# Altium schematic symbol library IC_Maxim.SchLib: 843 symbols (part 17 of 20) (continued)
## MAX8510EXK15+ (continued)

## MAX8510EXK18+
designator U?
Ultra-Low-Noise, High PSRR, Low-Dropout, 120mA Linear Regulator, 1.8V Out, 5-Pin SC70, -40癈 to +85癈, Pb-Free; DatasheetVersion: Rev 4, Aug-2011; PackageVersion: revE, 2006; PackageReference: X5+1; PackageDescription: 5-Pin SC70 Transistor Package, 0.65 mm Pitch, 2.2 mm Lead Span; Code_JEDEC: MO-203; ComponentLink1Description: Manufacturer URL; ComponentLink1URL: http://www.maxim-ic.com; ComponentLink2Description: Datasheet; ComponentLink2URL: http://datasheets.maxim-ic.com/en/ds/MAX8510-MAX8512.pdf; ComponentLink3Description: Package Specification; ComponentLink3URL: http://pdfserv.maxim-ic.com/package_dwgs/21-0076.PDF
footprint SOT353 (Footprint not found)
pins: 1 IN (power), 2 GND (power), 3 ~{SHDN} (in), 4 BP, 5 OUT (power)

## MAX8510EXK18+G65
designator U?
Ultra-Low-Noise, High PSRR, Low-Dropout, 120mA Linear Regulator, 1.8V Out, 5-Pin SC70, -40癈 to +85癈, Pb-Free; DatasheetVersion: Rev 4, Aug-2011; PackageVersion: revE, 2006; PackageReference: X5+1; PackageDescription: 5-Pin SC70 Transistor Package, 0.65 mm Pitch, 2.2 mm Lead Span; Code_JEDEC: MO-203; ComponentLink1Description: Manufacturer URL; ComponentLink1URL: http://www.maxim-ic.com; ComponentLink2Description: Datasheet; ComponentLink2URL: http://datasheets.maxim-ic.com/en/ds/MAX8510-MAX8512.pdf; ComponentLink3Description: Package Specification; ComponentLink3URL: http://pdfserv.maxim-ic.com/package_dwgs/21-0076.PDF
footprint SOT353 (Footprint not found)
pins: 1 IN (power), 2 GND (power), 3 ~{SHDN} (in), 4 BP, 5 OUT (power)

## MAX8510EXK21+
designator U?
Ultra-Low-Noise, High PSRR, Low-Dropout, 120mA Linear Regulator, 5-Pin SC70, -40癈 to +85癈, Pb-Free; DatasheetVersion: Rev 4, Aug-2011; PackageVersion: revE, 2006; PackageReference: X5+1; PackageDescription: 5-Pin SC70 Transistor Package, 0.65 mm Pitch, 2.2 mm Lead Span; Code_JEDEC: MO-203; ComponentLink1Description: Manufacturer URL; ComponentLink1URL: http://www.maxim-ic.com; ComponentLink2Description: Datasheet; ComponentLink2URL: http://datasheets.maxim-ic.com/en/ds/MAX8510-MAX8512.pdf; ComponentLink3Description: Package Specification; ComponentLink3URL: http://pdfserv.maxim-ic.com/package_dwgs/21-0076.PDF
footprint SOT353 (Footprint not found)
pins: 1 IN (power), 2 GND (power), 3 ~{SHDN} (in), 4 BP, 5 OUT (power)

## MAX8510EXK25
designator U?
Ultra-Low-Noise, High PSRR, Low-Dropout, 120mA Linear Regulator, 2.5V Out, 5-Pin SC70, -40癈 to +85癈; DatasheetVersion: Rev 4, Aug-2011; PackageVersion: revE, 2006; PackageReference: X5-1; PackageDescription: 5-Pin SC70 Transistor Package, 0.65 mm Pitch, 2.2 mm Lead Span; Code_JEDEC: MO-203; ComponentLink1Description: Manufacturer URL; ComponentLink1URL: http://www.maxim-ic.com; ComponentLink2Description: Datasheet; ComponentLink2URL: http://datasheets.maxim-ic.com/en/ds/MAX8510-MAX8512.pdf; ComponentLink3Description: Package Specification; ComponentLink3URL: http://pdfserv.maxim-ic.com/package_dwgs/21-0076.PDF
footprint SOT353 (Footprint not found)
pins: 1 IN (power), 2 GND (power), 3 ~{SHDN} (in), 4 BP, 5 OUT (power)

## MAX8510EXK25+
designator U?
Ultra-Low-Noise, High PSRR, Low-Dropout, 120mA Linear Regulator, 2.5V Out, 5-Pin SC70, -40癈 to +85癈, Pb-Free; DatasheetVersion: Rev 4, Aug-2011; PackageVersion: revE, 2006; PackageReference: X5+1; PackageDescription: 5-Pin SC70 Transistor Package, 0.65 mm Pitch, 2.2 mm Lead Span; Code_JEDEC: MO-203; ComponentLink1Description: Manufacturer URL; ComponentLink1URL: http://www.maxim-ic.com; ComponentLink2Description: Datasheet; ComponentLink2URL: http://datasheets.maxim-ic.com/en/ds/MAX8510-MAX8512.pdf; ComponentLink3Description: Package Specification; ComponentLink3URL: http://pdfserv.maxim-ic.com/package_dwgs/21-0076.PDF
footprint SOT353 (Footprint not found)
pins: 1 IN (power), 2 GND (power), 3 ~{SHDN} (in), 4 BP, 5 OUT (power)

## MAX8510EXK27
designator U?
Ultra-Low-Noise, High PSRR, Low-Dropout, 120mA Linear Regulator, 2.7V Out, 5-Pin SC70, -40癈 to +85癈; DatasheetVersion: Rev 4, Aug-2011; PackageVersion: revE, 2006; PackageReference: X5-1; PackageDescription: 5-Pin SC70 Transistor Package, 0.65 mm Pitch, 2.2 mm Lead Span; Code_JEDEC: MO-203; ComponentLink1Description: Manufacturer URL; ComponentLink1URL: http://www.maxim-ic.com; ComponentLink2Description: Datasheet; ComponentLink2URL: http://datasheets.maxim-ic.com/en/ds/MAX8510-MAX8512.pdf; ComponentLink3Description: Package Specification; ComponentLink3URL: http://pdfserv.maxim-ic.com/package_dwgs/21-0076.PDF
footprint SOT353 (Footprint not found)
pins: 1 IN (power), 2 GND (power), 3 ~{SHDN} (in), 4 BP, 5 OUT (power)

## MAX8510EXK27+
designator U?
Ultra-Low-Noise, High PSRR, Low-Dropout, 120mA Linear Regulator, 2.7V Out, 5-Pin SC70, -40癈 to +85癈, Pb-Free; DatasheetVersion: Rev 4, Aug-2011; PackageVersion: revE, 2006; PackageReference: X5+1; PackageDescription: 5-Pin SC70 Transistor Package, 0.65 mm Pitch, 2.2 mm Lead Span; Code_JEDEC: MO-203; ComponentLink1Description: Manufacturer URL; ComponentLink1URL: http://www.maxim-ic.com; ComponentLink2Description: Datasheet; ComponentLink2URL: http://datasheets.maxim-ic.com/en/ds/MAX8510-MAX8512.pdf; ComponentLink3Description: Package Specification; ComponentLink3URL: http://pdfserv.maxim-ic.com/package_dwgs/21-0076.PDF
footprint SOT353 (Footprint not found)
pins: 1 IN (power), 2 GND (power), 3 ~{SHDN} (in), 4 BP, 5 OUT (power)

## MAX8510EXK28+
designator U?
Ultra-Low-Noise, High PSRR, Low-Dropout, 120mA Linear Regulator, 2.8V Out, 5-Pin SC70, -40癈 to +85癈, Pb-Free; DatasheetVersion: Rev 4, Aug-2011; PackageVersion: revE, 2006; PackageReference: X5+1; PackageDescription: 5-Pin SC70 Transistor Package, 0.65 mm Pitch, 2.2 mm Lead Span; Code_JEDEC: MO-203; ComponentLink1Description: Manufacturer URL; ComponentLink1URL: http://www.maxim-ic.com; ComponentLink2Description: Datasheet; ComponentLink2URL: http://datasheets.maxim-ic.com/en/ds/MAX8510-MAX8512.pdf; ComponentLink3Description: Package Specification; ComponentLink3URL: http://pdfserv.maxim-ic.com/package_dwgs/21-0076.PDF
footprint SOT353 (Footprint not found)
pins: 1 IN (power), 2 GND (power), 3 ~{SHDN} (in), 4 BP, 5 OUT (power)

## MAX8510EXK29+
designator U?
Ultra-Low-Noise, High PSRR, Low-Dropout, 120mA Linear Regulator, 2.85V Out, 5-Pin SC70, -40癈 to +85癈, Pb-Free; DatasheetVersion: Rev 4, Aug-2011; PackageVersion: revE, 2006; PackageReference: X5+1; PackageDescription: 5-Pin SC70 Transistor Package, 0.65 mm Pitch, 2.2 mm Lead Span; Code_JEDEC: MO-203; ComponentLink1Description: Manufacturer URL; ComponentLink1URL: http://www.maxim-ic.com; ComponentLink2Description: Datasheet; ComponentLink2URL: http://datasheets.maxim-ic.com/en/ds/MAX8510-MAX8512.pdf; ComponentLink3Description: Package Specification; ComponentLink3URL: http://pdfserv.maxim-ic.com/package_dwgs/21-0076.PDF
footprint SOT353 (Footprint not found)
pins: 1 IN (power), 2 GND (power), 3 ~{SHDN} (in), 4 BP, 5 OUT (power)

## MAX8510EXK30
designator U?
Ultra-Low-Noise, High PSRR, Low-Dropout, 120mA Linear Regulator, 3V Out, 5-Pin SC70, -40癈 to +85癈; DatasheetVersion: Rev 4, Aug-2011; PackageVersion: revE, 2006; PackageReference: X5-1; PackageDescription: 5-Pin SC70 Transistor Package, 0.65 mm Pitch, 2.2 mm Lead Span; Code_JEDEC: MO-203; ComponentLink1Description: Manufacturer URL; ComponentLink1URL: http://www.maxim-ic.com; ComponentLink2Description: Datasheet; ComponentLink2URL: http://datasheets.maxim-ic.com/en/ds/MAX8510-MAX8512.pdf; ComponentLink3Description: Package Specification; ComponentLink3URL: http://pdfserv.maxim-ic.com/package_dwgs/21-0076.PDF
footprint SOT353 (Footprint not found)
pins: 1 IN (power), 2 GND (power), 3 ~{SHDN} (in), 4 BP, 5 OUT (power)

## MAX8510EXK30+
designator U?
Ultra-Low-Noise, High PSRR, Low-Dropout, 120mA Linear Regulator, 3V Out, 5-Pin SC70, -40癈 to +85癈, Pb-Free; DatasheetVersion: Rev 4, Aug-2011; PackageVersion: revE, 2006; PackageReference: X5+1; PackageDescription: 5-Pin SC70 Transistor Package, 0.65 mm Pitch, 2.2 mm Lead Span; Code_JEDEC: MO-203; ComponentLink1Description: Manufacturer URL; ComponentLink1URL: http://www.maxim-ic.com; ComponentLink2Description: Datasheet; ComponentLink2URL: http://datasheets.maxim-ic.com/en/ds/MAX8510-MAX8512.pdf; ComponentLink3Description: Package Specification; ComponentLink3URL: http://pdfserv.maxim-ic.com/package_dwgs/21-0076.PDF
footprint SOT353 (Footprint not found)
pins: 1 IN (power), 2 GND (power), 3 ~{SHDN} (in), 4 BP, 5 OUT (power)

## MAX8510EXK45+
designator U?
Ultra-Low-Noise, High PSRR, Low-Dropout, 120mA Linear Regulator, 4.5V Out, 5-Pin SC70, -40癈 to +85癈, Pb-Free; DatasheetVersion: Rev 4, Aug-2011; PackageVersion: revE, 2006; PackageReference: X5+1; PackageDescription: 5-Pin SC70 Transistor Package, 0.65 mm Pitch, 2.2 mm Lead Span; Code_JEDEC: MO-203; ComponentLink1Description: Manufacturer URL; ComponentLink1URL: http://www.maxim-ic.com; ComponentLink2Description: Datasheet; ComponentLink2URL: http://datasheets.maxim-ic.com/en/ds/MAX8510-MAX8512.pdf; ComponentLink3Description: Package Specification; ComponentLink3URL: http://pdfserv.maxim-ic.com/package_dwgs/21-0076.PDF
footprint SOT353 (Footprint not found)
pins: 1 IN (power), 2 GND (power), 3 ~{SHDN} (in), 4 BP, 5 OUT (power)

## MAX8511ETA31+
designator U?
Ultra-Low-Noise, High PSRR, Low-Dropout, 120mA Linear Regulator, 3.1V Out, 8-Pin TDFN-EP, -40癈 to +85癈, Pb-Free; DatasheetVersion: Rev 4, Aug-2011; PackageVersion: revF, 2011; PackageReference: T822+1; PackageDescription: 8-Pin Plastic Very Very Thin Dual Flatpack, No Leads, 2 x 2 x 0.75 mm Body, 0.5 mm Pitch, TDFN, Pb-Free; Code_JEDEC: MO-229*; ComponentLink1Description: Manufacturer URL; ComponentLink1URL: http://www.maxim-ic.com; ComponentLink2Description: Datasheet; ComponentLink2URL: http://datasheets.maxim-ic.com/en/ds/MAX8510-MAX8512.pdf; ComponentLink3Description: Package Specification; ComponentLink3URL: http://pdfserv.maxim-ic.com/package_dwgs/21-0168.PDF
footprint DFN8_0.5-PAD(2X2) (Footprint not found)
pins: 1 NC, 2 NC, 3 GND (power), 4 ~{SHDN} (in), 5 IN (power), 6 NC, 7 OUT (power), 8 NC, 9 EP (power)

## MAX8511EXK15+
designator U?
Ultra-Low-Noise, High PSRR, Low-Dropout, 120mA Linear Regulator, 1.5V Out, 5-Pin SC70, -40癈 to +85癈, Pb-Free; DatasheetVersion: Rev 4, Aug-2011; PackageVersion: revE, 2006; PackageReference: X5+1; PackageDescription: 5-Pin SC70 Transistor Package, 0.65 mm Pitch, 2.2 mm Lead Span; Code_JEDEC: MO-203; ComponentLink1Description: Manufacturer URL; ComponentLink1URL: http://www.maxim-ic.com; ComponentLink2Description: Datasheet; ComponentLink2URL: http://datasheets.maxim-ic.com/en/ds/MAX8510-MAX8512.pdf; ComponentLink3Description: Package Specification; ComponentLink3URL: http://pdfserv.maxim-ic.com/package_dwgs/21-0076.PDF
footprint SOT353 (Footprint not found)
pins: 1 IN (power), 2 GND (power), 3 ~{SHDN} (in), 4 NC, 5 OUT (power)

## MAX8511EXK18+
designator U?
Ultra-Low-Noise, High PSRR, Low-Dropout, 120mA Linear Regulator, 1.8V Out, 5-Pin SC70, -40癈 to +85癈, Pb-Free; DatasheetVersion: Rev 4, Aug-2011; PackageVersion: revE, 2006; PackageReference: X5+1; PackageDescription: 5-Pin SC70 Transistor Package, 0.65 mm Pitch, 2.2 mm Lead Span; Code_JEDEC: MO-203; ComponentLink1Description: Manufacturer URL; ComponentLink1URL: http://www.maxim-ic.com; ComponentLink2Description: Datasheet; ComponentLink2URL: http://datasheets.maxim-ic.com/en/ds/MAX8510-MAX8512.pdf; ComponentLink3Description: Package Specification; ComponentLink3URL: http://pdfserv.maxim-ic.com/package_dwgs/21-0076.PDF
footprint SOT353 (Footprint not found)
pins: 1 IN (power), 2 GND (power), 3 ~{SHDN} (in), 4 NC, 5 OUT (power)

## MAX8511EXK26+
designator U?
Ultra-Low-Noise, High PSRR, Low-Dropout, 120mA Linear Regulator, 2.6V Out, 5-Pin SC70, -40癈 to +85癈, Pb-Free; DatasheetVersion: Rev 4, Aug-2011; PackageVersion: revE, 2006; PackageReference: X5+1; PackageDescription: 5-Pin SC70 Transistor Package, 0.65 mm Pitch, 2.2 mm Lead Span; Code_JEDEC: MO-203; ComponentLink1Description: Manufacturer URL; ComponentLink1URL: http://www.maxim-ic.com; ComponentLink2Description: Datasheet; ComponentLink2URL: http://datasheets.maxim-ic.com/en/ds/MAX8510-MAX8512.pdf; ComponentLink3Description: Package Specification; ComponentLink3URL: http://pdfserv.maxim-ic.com/package_dwgs/21-0076.PDF
footprint SOT353 (Footprint not found)
pins: 1 IN (power), 2 GND (power), 3 ~{SHDN} (in), 4 NC, 5 OUT (power)

## MAX8511EXK28+
designator U?
Ultra-Low-Noise, High PSRR, Low-Dropout, 120mA Linear Regulator, 2.8V Out, 5-Pin SC70, -40癈 to +85癈, Pb-Free; DatasheetVersion: Rev 4, Aug-2011; PackageVersion: revE, 2006; PackageReference: X5+1; PackageDescription: 5-Pin SC70 Transistor Package, 0.65 mm Pitch, 2.2 mm Lead Span; Code_JEDEC: MO-203; ComponentLink1Description: Manufacturer URL; ComponentLink1URL: http://www.maxim-ic.com; ComponentLink2Description: Datasheet; ComponentLink2URL: http://datasheets.maxim-ic.com/en/ds/MAX8510-MAX8512.pdf; ComponentLink3Description: Package Specification; ComponentLink3URL: http://pdfserv.maxim-ic.com/package_dwgs/21-0076.PDF
footprint SOT353 (Footprint not found)
pins: 1 IN (power), 2 GND (power), 3 ~{SHDN} (in), 4 NC, 5 OUT (power)

## MAX8511EXK29+
designator U?
Ultra-Low-Noise, High PSRR, Low-Dropout, 120mA Linear Regulator, 2.85V Out, 5-Pin SC70, -40癈 to +85癈, Pb-Free; DatasheetVersion: Rev 4, Aug-2011; PackageVersion: revE, 2006; PackageReference: X5+1; PackageDescription: 5-Pin SC70 Transistor Package, 0.65 mm Pitch, 2.2 mm Lead Span; Code_JEDEC: MO-203; ComponentLink1Description: Manufacturer URL; ComponentLink1URL: http://www.maxim-ic.com; ComponentLink2Description: Datasheet; ComponentLink2URL: http://datasheets.maxim-ic.com/en/ds/MAX8510-MAX8512.pdf; ComponentLink3Description: Package Specification; ComponentLink3URL: http://pdfserv.maxim-ic.com/package_dwgs/21-0076.PDF
footprint SOT353 (Footprint not found)
pins: 1 IN (power), 2 GND (power), 3 ~{SHDN} (in), 4 NC, 5 OUT (power)

## MAX8511EXK33+
designator U?
Ultra-Low-Noise, High PSRR, Low-Dropout, 120mA Linear Regulator, 3.3V Out, 5-Pin SC70, -40癈 to +85癈, Pb-Free; DatasheetVersion: Rev 4, Aug-2011; PackageVersion: revE, 2006; PackageReference: X5+1; PackageDescription: 5-Pin SC70 Transistor Package, 0.65 mm Pitch, 2.2 mm Lead Span; Code_JEDEC: MO-203; ComponentLink1Description: Manufacturer URL; ComponentLink1URL: http://www.maxim-ic.com; ComponentLink2Description: Datasheet; ComponentLink2URL: http://datasheets.maxim-ic.com/en/ds/MAX8510-MAX8512.pdf; ComponentLink3Description: Package Specification; ComponentLink3URL: http://pdfserv.maxim-ic.com/package_dwgs/21-0076.PDF
footprint SOT353 (Footprint not found)
pins: 1 IN (power), 2 GND (power), 3 ~{SHDN} (in), 4 NC, 5 OUT (power)

## MAX8511EXK35+
designator U?
Ultra-Low-Noise, High PSRR, Low-Dropout, 120mA Linear Regulator, 5-Pin SC70, -40癈 to +85癈, Pb-Free; DatasheetVersion: Rev 4, Aug-2011; PackageVersion: revE, 2006; PackageReference: X5+1; PackageDescription: 5-Pin SC70 Transistor Package, 0.65 mm Pitch, 2.2 mm Lead Span; Code_JEDEC: MO-203; ComponentLink1Description: Manufacturer URL; ComponentLink1URL: http://www.maxim-ic.com; ComponentLink2Description: Datasheet; ComponentLink2URL: http://datasheets.maxim-ic.com/en/ds/MAX8510-MAX8512.pdf; ComponentLink3Description: Package Specification; ComponentLink3URL: http://pdfserv.maxim-ic.com/package_dwgs/21-0076.PDF
footprint SOT353 (Footprint not found)
pins: 1 IN (power), 2 GND (power), 3 ~{SHDN} (in), 4 NC, 5 OUT (power)

## MAX8511EXK45+
designator U?
Ultra-Low-Noise, High PSRR, Low-Dropout, 120mA Linear Regulator, 4.5V Out, 5-Pin SC70, -40癈 to +85癈, Pb-Free; DatasheetVersion: Rev 4, Aug-2011; PackageVersion: revE, 2006; PackageReference: X5+1; PackageDescription: 5-Pin SC70 Transistor Package, 0.65 mm Pitch, 2.2 mm Lead Span; Code_JEDEC: MO-203; ComponentLink1Description: Manufacturer URL; ComponentLink1URL: http://www.maxim-ic.com; ComponentLink2Description: Datasheet; ComponentLink2URL: http://datasheets.maxim-ic.com/en/ds/MAX8510-MAX8512.pdf; ComponentLink3Description: Package Specification; ComponentLink3URL: http://pdfserv.maxim-ic.com/package_dwgs/21-0076.PDF
footprint SOT353 (Footprint not found)
pins: 1 IN (power), 2 GND (power), 3 ~{SHDN} (in), 4 NC, 5 OUT (power)

## MAX8512EXK+
designator U?
Ultra-Low-Noise, High PSRR, Low-Dropout, 120mA Linear Regulator, Adjustable Vout, 5-Pin SC70, -40癈 to +85癈, Pb-Free; DatasheetVersion: Rev 4, Aug-2011; PackageVersion: revE, 2006; PackageReference: X5+1; PackageDescription: 5-Pin SC70 Transistor Package, 0.65 mm Pitch, 2.2 mm Lead Span; Code_JEDEC: MO-203; ComponentLink1Description: Manufacturer URL; ComponentLink1URL: http://www.maxim-ic.com; ComponentLink2Description: Datasheet; ComponentLink2URL: http://datasheets.maxim-ic.com/en/ds/MAX8510-MAX8512.pdf; ComponentLink3Description: Package Specification; ComponentLink3URL: http://pdfserv.maxim-ic.com/package_dwgs/21-0076.PDF
footprint SOT353 (Footprint not found)
pins: 1 IN (power), 2 GND (power), 3 ~{SHDN} (in), 4 FB (in), 5 OUT (power)

## MAX8516EUB
designator U?
1.425V to 3.6V Input, 1A, 0.2V Dropout LDO Regulator, 10-Pin uMax-EP, -40癈 to +85癈; DatasheetVersion: Rev 2, Sep-2009; PackageVersion: revF, 2011; PackageReference: U10E-3; PackageDescription: 10-Pin Micro-MAX, Thin Shrink Small-Outline, 0.5 mm Pitch, Exposed Pad, uMax, uSOP; ComponentLink1Description: Manufacturer URL; ComponentLink1URL: http://www.maxim-ic.com; ComponentLink2Description: Datasheet; ComponentLink2URL: http://datasheets.maxim-ic.com/en/ds/MAX8516-MAX8518.pdf; ComponentLink3Description: Package Specification; ComponentLink3URL: http://pdfserv.maxim-ic.com/package_dwgs/21-0109.PDF
footprint VSSOP10_0.5-PAD (Footprint not found)
pins: 1 EN (in), 2 IN (power), 3 IN (power), 4 NC, 5 NC, 6 GND (power), 7 FB (in), 8 OUT (power), 9 OUT (power), 10 NC, 11 EP (power)

## MAX8516EUB+
designator U?
1.425V to 3.6V Input, 1A, 0.2V Dropout LDO Regulator, 10-Pin uMax-EP, -40癈 to +85癈, Pb-Free; DatasheetVersion: Rev 2, Sep-2009; PackageVersion: revF, 2011; PackageReference: U10E+3; PackageDescription: 10-Pin Micro-MAX, Thin Shrink Small-Outline, 0.5 mm Pitch, Exposed Pad, uMax, uSOP, Pb-Free; ComponentLink1Description: Manufacturer URL; ComponentLink1URL: http://www.maxim-ic.com; ComponentLink2Description: Datasheet; ComponentLink2URL: http://datasheets.maxim-ic.com/en/ds/MAX8516-MAX8518.pdf; ComponentLink3Description: Package Specification; ComponentLink3URL: http://pdfserv.maxim-ic.com/package_dwgs/21-0109.PDF
footprint VSSOP10_0.5-PAD (Footprint not found)
pins: 1 EN (in), 2 IN (power), 3 IN (power), 4 NC, 5 NC, 6 GND (power), 7 FB (in), 8 OUT (power), 9 OUT (power), 10 NC, 11 EP (power)

## MAX8516EUB/V+
designator U?
1.425V to 3.6V Input, 1A, 0.2V Dropout LDO Regulator, Automotive Qualified, 10-Pin uMax-EP, -40癈 to +85癈, Pb-Free; DatasheetVersion: Rev 2, Sep-2009; PackageVersion: revF, 2011; PackageReference: U10E+3; PackageDescription: 10-Pin Micro-MAX, Thin Shrink Small-Outline, 0.5 mm Pitch, Exposed Pad, uMax, uSOP, Pb-Free; ComponentLink1Description: Manufacturer URL; ComponentLink1URL: http://www.maxim-ic.com; ComponentLink2Description: Datasheet; ComponentLink2URL: http://datasheets.maxim-ic.com/en/ds/MAX8516-MAX8518.pdf; ComponentLink3Description: Package Specification; ComponentLink3URL: http://pdfserv.maxim-ic.com/package_dwgs/21-0109.PDF
footprint VSSOP10_0.5-PAD (Footprint not found)
pins: 1 EN (in), 2 IN (power), 3 IN (power), 4 NC, 5 NC, 6 GND (power), 7 FB (in), 8 OUT (power), 9 OUT (power), 10 NC, 11 EP (power)

## MAX8517EUB
designator U?
1.425V to 3.6V Input, 1A, 0.2V Dropout LDO Regulator with POK Output, 10-Pin uMax-EP, -40癈 to +85癈; DatasheetVersion: Rev 2, Sep-2009; PackageVersion: revF, 2011; PackageReference: U10E-3; PackageDescription: 10-Pin Micro-MAX, Thin Shrink Small-Outline, 0.5 mm Pitch, Exposed Pad, uMax, uSOP; ComponentLink1Description: Manufacturer URL; ComponentLink1URL: http://www.maxim-ic.com; ComponentLink2Description: Datasheet; ComponentLink2URL: http://datasheets.maxim-ic.com/en/ds/MAX8516-MAX8518.pdf; ComponentLink3Description: Package Specification; ComponentLink3URL: http://pdfserv.maxim-ic.com/package_dwgs/21-0109.PDF
footprint VSSOP10_0.5-PAD (Footprint not found)
pins: 1 EN (in), 2 IN (power), 3 IN (power), 4 POK (oc), 5 NC, 6 GND (power), 7 FB (in), 8 OUT (power), 9 OUT (power), 10 NC, 11 EP (power)

## MAX8517EUB+
designator U?
1.425V to 3.6V Input, 1A, 0.2V Dropout LDO Regulator with POK Output, 10-Pin uMax-EP, -40癈 to +85癈, Pb-Free; DatasheetVersion: Rev 2, Sep-2009; PackageVersion: revF, 2011; PackageReference: U10E+3; PackageDescription: 10-Pin Micro-MAX, Thin Shrink Small-Outline, 0.5 mm Pitch, Exposed Pad, uMax, uSOP, Pb-Free; ComponentLink1Description: Manufacturer URL; ComponentLink1URL: http://www.maxim-ic.com; ComponentLink2Description: Datasheet; ComponentLink2URL: http://datasheets.maxim-ic.com/en/ds/MAX8516-MAX8518.pdf; ComponentLink3Description: Package Specification; ComponentLink3URL: http://pdfserv.maxim-ic.com/package_dwgs/21-0109.PDF
footprint VSSOP10_0.5-PAD (Footprint not found)
pins: 1 EN (in), 2 IN (power), 3 IN (power), 4 POK (oc), 5 NC, 6 GND (power), 7 FB (in), 8 OUT (power), 9 OUT (power), 10 NC, 11 EP (power)

## MAX8518EUB
designator U?
1.425V to 3.6V Input, 1A, 0.2V Dropout LDO Regulator with 150ms Power-On Reset Output, 10-Pin uMax-EP, -40癈 to +85癈; DatasheetVersion: Rev 2, Sep-2009; PackageVersion: revF, 2011; PackageReference: U10E-3; PackageDescription: 10-Pin Micro-MAX, Thin Shrink Small-Outline, 0.5 mm Pitch, Exposed Pad, uMax, uSOP; ComponentLink1Description: Manufacturer URL; ComponentLink1URL: http://www.maxim-ic.com; ComponentLink2Description: Datasheet; ComponentLink2URL: http://datasheets.maxim-ic.com/en/ds/MAX8516-MAX8518.pdf; ComponentLink3Description: Package Specification; ComponentLink3URL: http://pdfserv.maxim-ic.com/package_dwgs/21-0109.PDF
footprint VSSOP10_0.5-PAD (Footprint not found)
pins: 1 EN (in), 2 IN (power), 3 IN (power), 4 NC, 5 POR (oc), 6 GND (power), 7 FB (in), 8 OUT (power), 9 OUT (power), 10 NC, 11 EP (power)

## MAX8518EUB+
designator U?
1.425V to 3.6V Input, 1A, 0.2V Dropout LDO Regulator with 150ms Power-On Reset Output, 10-Pin uMax-EP, -40癈 to +85癈, Pb-Free; DatasheetVersion: Rev 2, Sep-2009; PackageVersion: revF, 2011; PackageReference: U10E+3; PackageDescription: 10-Pin Micro-MAX, Thin Shrink Small-Outline, 0.5 mm Pitch, Exposed Pad, uMax, uSOP, Pb-Free; ComponentLink1Description: Manufacturer URL; ComponentLink1URL: http://www.maxim-ic.com; ComponentLink2Description: Datasheet; ComponentLink2URL: http://datasheets.maxim-ic.com/en/ds/MAX8516-MAX8518.pdf; ComponentLink3Description: Package Specification; ComponentLink3URL: http://pdfserv.maxim-ic.com/package_dwgs/21-0109.PDF
footprint VSSOP10_0.5-PAD (Footprint not found)
pins: 1 EN (in), 2 IN (power), 3 IN (power), 4 NC, 5 POR (oc), 6 GND (power), 7 FB (in), 8 OUT (power), 9 OUT (power), 10 NC, 11 EP (power)

## MAX8526EUD
designator U?
1.425V to 3.6V Input, 2A, 0.2V Dropout LDO Regulator, 14-Pin TSSOP-EP, -40癈 to +85癈; DatasheetVersion: Rev 2, Aug-2009; PackageVersion: revK, 2010; PackageReference: U14E-3; PackageDescription: 14-Pin Thin Shrink Small-Outline Package, Exposed Pad, 5 x 4.4 mm Body ,0.65 mm Pitch; Code_JEDEC: MO-153-ABT-1; ComponentLink1Description: Manufacturer URL; ComponentLink1URL: http://www.maxim-ic.com; ComponentLink2Description: Datasheet; ComponentLink2URL: http://datasheets.maxim-ic.com/en/ds/MAX8526-MAX8528.pdf; ComponentLink3Description: Package Specification; ComponentLink3URL: http://pdfserv.maxim-ic.com/package_dwgs/21-0108.PDF
footprint TSSOP14_0.65-PAD (Footprint not found)
pins: 1 EN (in), 2 IN (power), 3 IN (power), 4 IN (power), 5 IN (power), 6 TP, 7 TP, 8 GND (power), 9 FB (in), 10 OUT (power), 11 OUT (power), 12 OUT (power), 13 OUT (power), 14 TP, 15 EP (power)

## MAX8526EUD+
designator U?
1.425V to 3.6V Input, 2A, 0.2V Dropout LDO Regulator, 14-Pin TSSOP-EP, -40癈 to +85癈, Pb-Free; DatasheetVersion: Rev 2, Aug-2009; PackageVersion: revK, 2010; PackageReference: U14E+3; PackageDescription: 14-Pin Thin Shrink Small-Outline Package, Exposed Pad, 5 x 4.4 mm Body ,0.65 mm Pitch, Pb-Free; Code_JEDEC: MO-153-ABT-1; ComponentLink1Description: Manufacturer URL; ComponentLink1URL: http://www.maxim-ic.com; ComponentLink2Description: Datasheet; ComponentLink2URL: http://datasheets.maxim-ic.com/en/ds/MAX8526-MAX8528.pdf; ComponentLink3Description: Package Specification; ComponentLink3URL: http://pdfserv.maxim-ic.com/package_dwgs/21-0108.PDF
footprint TSSOP14_0.65-PAD (Footprint not found)
pins: 1 EN (in), 2 IN (power), 3 IN (power), 4 IN (power), 5 IN (power), 6 TP, 7 TP, 8 GND (power), 9 FB (in), 10 OUT (power), 11 OUT (power), 12 OUT (power), 13 OUT (power), 14 TP, 15 EP (power)

## MAX8527EUD
designator U?
1.425V to 3.6V Input, 2A, 0.2V Dropout LDO Regulator with POK Output, 14-Pin TSSOP-EP, -40癈 to +85癈; DatasheetVersion: Rev 2, Aug-2009; PackageVersion: revK, 2010; PackageReference: U14E-3; PackageDescription: 14-Pin Thin Shrink Small-Outline Package, Exposed Pad, 5 x 4.4 mm Body ,0.65 mm Pitch; Code_JEDEC: MO-153-ABT-1; ComponentLink1Description: Manufacturer URL; ComponentLink1URL: http://www.maxim-ic.com; ComponentLink2Description: Datasheet; ComponentLink2URL: http://datasheets.maxim-ic.com/en/ds/MAX8526-MAX8528.pdf; ComponentLink3Description: Package Specification; ComponentLink3URL: http://pdfserv.maxim-ic.com/package_dwgs/21-0108.PDF
footprint TSSOP14_0.65-PAD (Footprint not found)
pins: 1 EN (in), 2 IN (power), 3 IN (power), 4 IN (power), 5 IN (power), 6 POK (oc), 7 TP, 8 GND (power), 9 FB (in), 10 OUT (power), 11 OUT (power), 12 OUT (power), 13 OUT (power), 14 TP, 15 EP (power)

## MAX8527EUD+
designator U?
1.425V to 3.6V Input, 2A, 0.2V Dropout LDO Regulator with POK Output, 14-Pin TSSOP-EP, -40癈 to +85癈, Pb-Free; DatasheetVersion: Rev 2, Aug-2009; PackageVersion: revK, 2010; PackageReference: U14E+3; PackageDescription: 14-Pin Thin Shrink Small-Outline Package, Exposed Pad, 5 x 4.4 mm Body ,0.65 mm Pitch, Pb-Free; Code_JEDEC: MO-153-ABT-1; ComponentLink1Description: Manufacturer URL; ComponentLink1URL: http://www.maxim-ic.com; ComponentLink2Description: Datasheet; ComponentLink2URL: http://datasheets.maxim-ic.com/en/ds/MAX8526-MAX8528.pdf; ComponentLink3Description: Package Specification; ComponentLink3URL: http://pdfserv.maxim-ic.com/package_dwgs/21-0108.PDF
footprint TSSOP14_0.65-PAD (Footprint not found)
pins: 1 EN (in), 2 IN (power), 3 IN (power), 4 IN (power), 5 IN (power), 6 POK (oc), 7 TP, 8 GND (power), 9 FB (in), 10 OUT (power), 11 OUT (power), 12 OUT (power), 13 OUT (power), 14 TP, 15 EP (power)

## MAX8527EUD/V+
designator U?
1.425V to 3.6V Input, 2A, 0.2V Dropout LDO Regulator with POK Output, Automotive Qualified, 14-Pin TSSOP-EP, -40癈 to +85癈, Pb-Free; DatasheetVersion: Rev 2, Aug-2009; PackageVersion: revK, 2010; PackageReference: U14E+3; PackageDescription: 14-Pin Thin Shrink Small-Outline Package, Exposed Pad, 5 x 4.4 mm Body ,0.65 mm Pitch, Pb-Free; Code_JEDEC: MO-153-ABT-1; ComponentLink1Description: Manufacturer URL; ComponentLink1URL: http://www.maxim-ic.com; ComponentLink2Description: Datasheet; ComponentLink2URL: http://datasheets.maxim-ic.com/en/ds/MAX8526-MAX8528.pdf; ComponentLink3Description: Package Specification; ComponentLink3URL: http://pdfserv.maxim-ic.com/package_dwgs/21-0108.PDF
footprint TSSOP14_0.65-PAD (Footprint not found)
pins: 1 EN (in), 2 IN (power), 3 IN (power), 4 IN (power), 5 IN (power), 6 POK (oc), 7 TP, 8 GND (power), 9 FB (in), 10 OUT (power), 11 OUT (power), 12 OUT (power), 13 OUT (power), 14 TP, 15 EP (power)

## MAX8528EUD
designator U?
1.425V to 3.6V Input, 2A, 0.2V Dropout LDO Regulator with 150ms Power-On Reset Output, 14-Pin TSSOP-EP, -40癈 to +85癈; DatasheetVersion: Rev 2, Aug-2009; PackageVersion: revK, 2010; PackageReference: U14E-3; PackageDescription: 14-Pin Thin Shrink Small-Outline Package, Exposed Pad, 5 x 4.4 mm Body ,0.65 mm Pitch; Code_JEDEC: MO-153-ABT-1; ComponentLink1Description: Manufacturer URL; ComponentLink1URL: http://www.maxim-ic.com; ComponentLink2Description: Datasheet; ComponentLink2URL: http://datasheets.maxim-ic.com/en/ds/MAX8526-MAX8528.pdf; ComponentLink3Description: Package Specification; ComponentLink3URL: http://pdfserv.maxim-ic.com/package_dwgs/21-0108.PDF
footprint TSSOP14_0.65-PAD (Footprint not found)
pins: 1 EN (in), 2 IN (power), 3 IN (power), 4 IN (power), 5 IN (power), 6 TP, 7 POR (oc), 8 GND (power), 9 FB (in), 10 OUT (power), 11 OUT (power), 12 OUT (power), 13 OUT (power), 14 TP, 15 EP (power)

## MAX8528EUD+
designator U?
1.425V to 3.6V Input, 2A, 0.2V Dropout LDO Regulator with 150ms Power-On Reset Output, 14-Pin TSSOP-EP, -40癈 to +85癈, Pb-Free; DatasheetVersion: Rev 2, Aug-2009; PackageVersion: revK, 2010; PackageReference: U14E+3; PackageDescription: 14-Pin Thin Shrink Small-Outline Package, Exposed Pad, 5 x 4.4 mm Body ,0.65 mm Pitch, Pb-Free; Code_JEDEC: MO-153-ABT-1; ComponentLink1Description: Manufacturer URL; ComponentLink1URL: http://www.maxim-ic.com; ComponentLink2Description: Datasheet; ComponentLink2URL: http://datasheets.maxim-ic.com/en/ds/MAX8526-MAX8528.pdf; ComponentLink3Description: Package Specification; ComponentLink3URL: http://pdfserv.maxim-ic.com/package_dwgs/21-0108.PDF
footprint TSSOP14_0.65-PAD (Footprint not found)
pins: 1 EN (in), 2 IN (power), 3 IN (power), 4 IN (power), 5 IN (power), 6 TP, 7 POR (oc), 8 GND (power), 9 FB (in), 10 OUT (power), 11 OUT (power), 12 OUT (power), 13 OUT (power), 14 TP, 15 EP (power)

## MAX8543EEE
designator U?
Step-Down Controllers with Prebias Startup, Lossless Sensing, Synchronization, and OVP, 16-Pin QSOP, -40癈 to +85癈; DatasheetVersion: Rev 0, May-2004; PackageVersion: revJ, 2009; PackageReference: E16-1; PackageDescription: 16-Pin Quarter Small-Outline Package (QSOP) 0.150" Width, 0.025" Pitch; Code_JEDEC: MO-137-AB; ComponentLink1Description: Manufacturer URL; ComponentLink1URL: http://www.maxim-ic.com; ComponentLink2Description: Datasheet; ComponentLink2URL: http://datasheets.maxim-ic.com/en/ds/MAX8543-MAX8544.pdf; ComponentLink3Description: Package Specification; ComponentLink3URL: http://pdfserv.maxim-ic.com/package_dwgs/21-0055.PDF
footprint SSOP16_0.635 (Footprint not found)
pins: 1 GND (power), 2 SS, 3 COMP, 4 FB (in), 5 EN (in), 6 CS- (in), 7 CS+ (in), 8 ILIM (in), 9 PGND (power), 10 DL (out), 11 VL (power), 12 IN (power), 13 LX, 14 DH (out), 15 BST, 16 FSYNC (in)
